# Altium footprint library 电阻封装库.PcbLib: 218 footprints (part 7 of 14)
Each footprint in its own frame and in the unit in brackets; x right, y up, seen from the top. Pads: shape width x height; smd on the part's side, far side on the other; paste and mask are expansions set on the pad; w line width, h text height; cw(c..) or ccw(c..) is an arc to the next point about the centre after c.
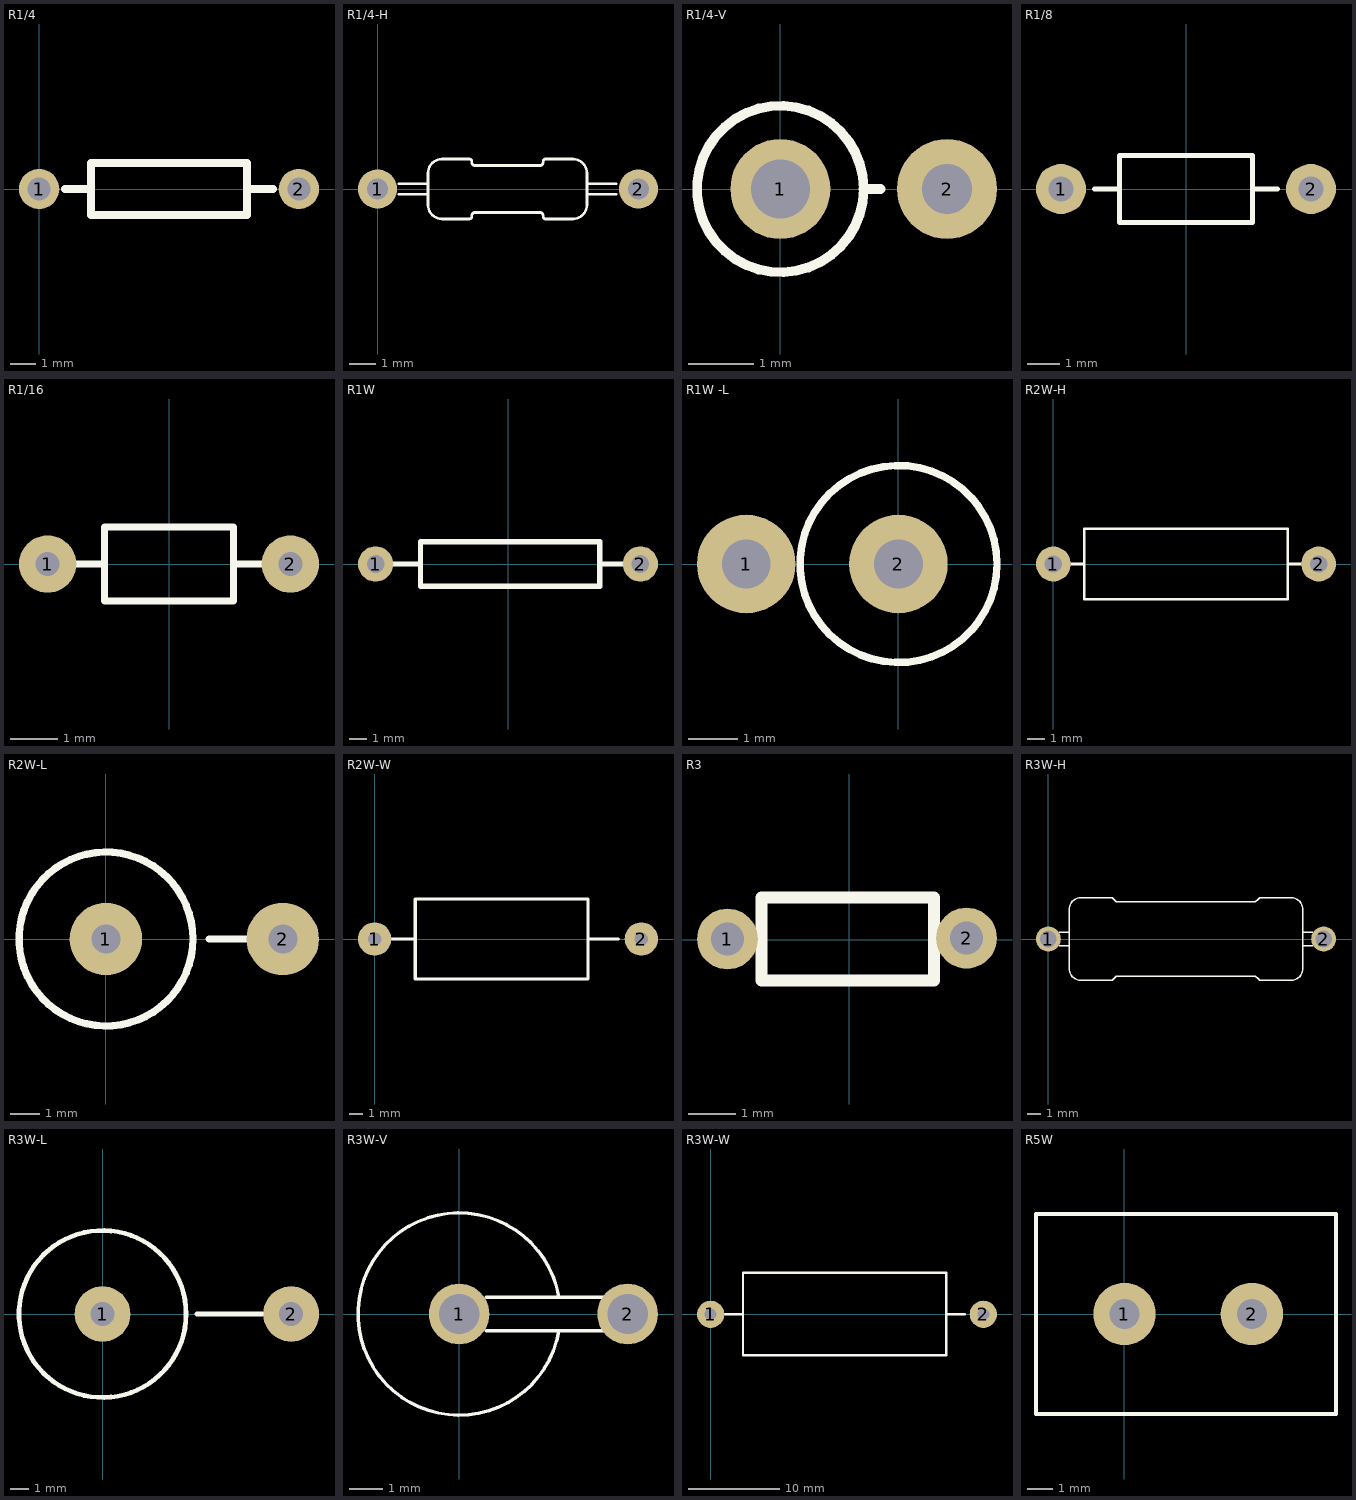
[diagram p6: the footprints below, top view; thin cyan lines are the x and y axes]

## R1/4 [mil]
pads (2):
  round 62 hole 35.43: 1(0,0) 2(400,0)
Top Overlay:
  lines w12: 40,0 80,0 ; 320,0 360,0 ; 80,-40 80,40 320,40 320,-40 80,-40

## R1/4-H [mm]
pads (2):
  round 1.5 hole 0.8: 1(0,0) 2(10,0)
Top Overlay:
  lines w0.1: 0.808,-0.2 1.932,-0.2 1.932,0.2 ; 0.808,0.2 1.932,0.2 ; 1.932,-0.2 1.932,-0.602 ccw(c2.48,-0.602) 2.48,-1.15 3.48,-1.15 3.508,-1.15 ccw(c3.508,-1.043) 3.615,-1.043 3.615,-1.015 cw(c3.73,-1.015) 3.73,-0.9 6.23,-0.9 cw(c6.23,-1.015) 6.345,-1.015 6.345,-1.043 ccw(c6.452,-1.043) 6.452,-1.15 6.48,-1.15 7.48,-1.15 ccw(c7.48,-0.602) 8.028,-0.602 8.028,-0.2 ; 8.028,0.2 9.152,0.2 ; 9.152,-0.2 8.028,-0.2 ; 1.932,0.2 1.932,0.602 cw(c2.48,0.602) 2.48,1.15 3.48,1.15 3.508,1.15 cw(c3.508,1.043) 3.615,1.043 3.615,1.015 ccw(c3.73,1.015) 3.73,0.9 6.23,0.9 ccw(c6.23,1.015) 6.345,1.015 6.345,1.043 cw(c6.452,1.043) 6.452,1.15 6.48,1.15 7.48,1.15 cw(c7.48,0.602) 8.028,0.602 8.028,0.2 8.028,-0.2
3D body "User Library-AXIAL_RESISTOR(0_25W).step": height 1.2, standoff -2.9, extent -0.4,-1.2 10.4,1.2

## R1/4-V [mil]
pads (2):
  round 60 hole 35.43: 1(0,0)
  round 60 hole 30: 2(100,0)
Top Overlay:
  circle w5.91: c0,0 r50
  lines w5.91: 50,0 60,0
3D body "User Library-Res_Stand.STEP": height 296.06, standoff -59.06, extent -36.3,-36.23 109.85,36.24

## R1/8 [mil]
pads (2):
  round 60 hole 30: 1(-150,0) 2(150,0)
Top Overlay:
  lines w5.91: -110,0 -80,0 ; 80,0 110,0 ; -80,-40 -80,40 80,40 80,-40 -80,-40
3D body "User Library-Resistencia-1.step": height 98.92, standoff -39.37, extent -160,-38.24 160,38.24

## R1/16 [mm]
pads (2):
  round 1.2 hole 0.5: 1(-2.54,0) 2(2.54,0)
Top Overlay:
  lines w0.15: -2.111,0 -1.349,0 ; 1.349,0 2.111,0 ; -1.347,-0.771 1.347,-0.771 1.347,0.774 -1.347,0.774 -1.347,-0.771
3D body "User Library-Resistencia-2.step": height 2.39, standoff -1, extent -2.794,-0.848 2.794,0.848

## R1W [mm]
pads (2):
  round 2 hole 1: 1(-7.5,0) 2(7.5,0)
Top Overlay:
  lines w0.305: -6.484,0 -4.96,0 ; 5.2,0 6.724,0 ; -4.96,-1.27 -4.96,1.27 5.2,1.27 5.2,-1.27 -4.96,-1.27

## R1W -L [mil]
pads (2):
  round 79 hole 39: 1(-122.05,0) 2(0,0)
Top Overlay:
  circle w6: c0,0 r79
3D body "1W Carbon Film Resistor.STEP": height 572.61, standoff -75.5, extent -137.23,-83.35 83.23,82

## R2W-H [mm]
pads (2):
  round 2 hole 1: 1(0,0) 2(15.24,0)
Top Overlay:
  lines w0.15: 0,0 1.778,0 ; 13.462,0 15.24,0 ; 1.778,-2.032 13.462,-2.032 13.462,2.032 1.778,2.032 1.778,-2.032
3D body "User Library-5083NW20K00J12AFX-2.STEP": height 4.39, standoff -1.8, extent -0.4,-1.75 15.64,1.75

## R2W-L [mm]
pads (2):
  round 2.5 hole 1: 1(0,0) 2(6.096,0)
Top Overlay:
  circle w0.254: c0,0 r3
  lines w0.254: 3.556,0 5.08,0

## R2W-W [mm]
pads (2):
  round 2.5 hole 1: 1(0,0) 2(20,0)
Top Overlay:
  lines w0.254: 1.016,0 3.048,0 ; 16,0 18.288,0 ; 3.048,-3 16,-3 16,3 3.048,3 3.048,-3

## R3 [mm]
pads (2):
  round 1.3 hole 0.7: 1(-2.6,0.02) 2(2.5,0.04)
Top Overlay:
  lines w0.254: -1.878,-0.869 1.805,-0.869 1.805,0.909 -1.878,0.909 -1.878,-0.869

## R3W-H [mm]
pads (2):
  round 1.8 hole 1.2: 1(0,0) 2(20,0)
Top Overlay:
  lines w0.1: 0.8,-0.5 1.5,-0.5 ; 0.8,0.5 1.5,0.5 ; 4.58,3.001 cw(c4.58,2.848) 4.688,2.956 ; 4.643,-3.001 4.828,-2.816 4.908,-2.736 cw(c4.995,-2.823) 4.995,-2.7 14.995,-2.7 cw(c14.995,-2.823) 15.082,-2.736 15.162,-2.816 15.347,-3.001 ; 4.688,-2.956 cw(c4.58,-2.848) 4.58,-3.001 2.347,-3.001 cw(c2.369,-2.131) 1.499,-2.109 1.5,2.109 cw(c2.369,2.131) 2.347,3.001 4.643,3.001 4.828,2.816 4.908,2.736 ccw(c4.995,2.823) 4.995,2.7 14.995,2.7 ccw(c14.995,2.823) 15.082,2.736 15.162,2.816 15.347,3.001 ; 15.302,-2.956 ccw(c15.41,-2.848) 15.41,-3.001 17.651,-3.001 ; 15.302,2.956 cw(c15.41,2.848) 15.41,3.001 15.41,3 17.652,3 cw(c17.63,2.131) 18.5,2.109 18.5,-2.109 cw(c17.63,-2.131) 17.652,-3 ; 18.5,-0.5 19.2,-0.5 ; 18.5,0.5 19.2,0.5
3D body "User Library-AXIAL_RESISTOR(3W).step": height 12.3, standoff -2, extent -0.605,-3.3 20.595,3.3

## R3W-L [mm]
pads (2):
  round 3 hole 1.3: 1(0,0) 2(10.16,0)
Top Overlay:
  circle w0.254: c0,0 r4.5
  lines w0.254: 5.08,0 8.636,0

## R3W-V [mm]
pads (2):
  round 1.8 hole 1.2: 1(0,0) 2(5,0)
Top Overlay:
  lines w0.1: 0.8,0.5 4.3,0.5 ; 0.805,-0.5 4.3,-0.5 ; 2.955,0.521 ccw(c0,0) 2.958,-0.503
3D body "User Library-AXIAL_RESISTOR(3W_VERT).STEP": height 23.3, standoff -3.1, extent -3.302,-3.3 5.598,3.3

## R3W-W [mm]
pads (2):
  round 3 hole 1.3: 1(0,0) 2(30,0)
Top Overlay:
  lines w0.254: 1.524,0 3.556,0 ; 3.556,4.5 3.556,-4.5 25.908,-4.5 25.908,4.5 ; 3.556,4.572 25.908,4.572 ; 25.908,0 27.94,0

## R5W [mm]
pads (2):
  round 2.5 hole 1.2: 1(0,0) 2(5.1,0)
Top Overlay:
  lines w0.15: -3.54,-4 -3.54,4 8.46,4 8.46,-4 -3.54,-4